# Altium integrated library Integrated_Library - 02.02.25 - 22.49.IntLib: 792 symbols (part 7 of 11) (continued)
## CMP-013-00032-2
designator Q?, comment FDPC5030SG
Asymmetric Dual N-Channel PowerTrench® Power Clip MOSFET, 30 V, -55 to 150 degC, 8-Pin PQFN, RoHS, Tape and Reel; Pins: 10
footprint ONSC-PQFN-8_V (QFN, 8-Leads, Body 5x6mm, Pitch 1.27mm)
footprint ONSC-PQFN-8_V (QFN, 8-Leads, Body 5x6mm, Pitch 1.27mm)
pins: 1 HSG, 2 GR, 3 HSD, 4 HSD, 5 SW, 6 SW, 7 SW, 8 LSG, 9 LSS, 10 HSD

## CMP-013-00033-2
designator Q?, comment DMC1030UFDBQ-7
MOSFET N/P-CH 12V 5.1A UDFN2020; Max Operating Temperature: 150°C; Min Operating Temperature: -55°C; Pins: 6
footprint DMC1030UFDBQ-7-Footprint-1
footprint DMC1030UFDBQ-7-Footprint-1
part A pins: 1 S1, 2 G1, 6 D1
part B pins: 3 D2, 4 S2, 5 G2

## CMP-014-000000-1
designator X?, comment PTS526SM15SMTR2_LFS
Tactile Switches 50mA 12VDC, 5.2x5.2mm, 1.5mm H, 160gf, G leads, No ground pin, metal actuator; Manufacturer_Name: C & K COMPONENTS; Manufacturer_Part_Number: PTS526SM15SMTR2 LFS; Geometry.Height: 1.65mm; Mouser Price/Stock: *; Design Item ID: PTS526SM15SMTR2_LFS; Datasheet Link: https://www.ckswitches.com/media/2780/pts526.pdf; Arrow Part Number: *; Source: PTS526SM15SMTR2_LFS.SchLib; Arrow Price/Stock: *; Mouser Part Number: *
footprint PTS526SM15SMTR2LFS
footprint PTS526SM15SMTR2LFS
pins: 1 COM_1, 2 COM_2, 3 NO_1, 4 NO_2

## CMP-014-00000-3
designator U?, comment TSV991AIQ1T
Rail-to-rail Input / Output GBP Operational Amplifier, 20 MHz, -40 to 125 degC, 6-Pin DFN, RoHS, Tape and Reel; Channels: 2; Min Operating Temperature: -40°C; Pins: 6; Max Operating Temperature: 125°C
footprint STM-DFN-8_V (DFN, 8-Leads, Body 2x2mm, Pitch 0.5mm)
footprint STM-DFN-8_V (DFN, 8-Leads, Body 2x2mm, Pitch 0.5mm)
pins: 1 IN- (in), 2 IN+ (in), 3 NC, 4 OUT (out), 5 VCC- (power), 6 VCC+ (power)

## CMP-014-00001-3
designator U?, comment INA230AIRGT
High or Low Side Measurement, 2.7 to 5.5 V, -40 to 125 degC, 16-Pin QFN, RoHS, Tape and Reel; Mounting Technology: SurfaceMount; Pins: 17
footprint RGT0016C_V (QFN, 16-Leads, Body 3x3mm, Pitch 0.5mm, Thermal Pad 1.65x1.65mm)
footprint RGT0016C_V (QFN, 16-Leads, Body 3x3mm, Pitch 0.5mm, Thermal Pad 1.65x1.65mm)
pins: 1 A0 (in), 2 A1 (in), 3 ALERT (oc), 4 SDA (io), 5 SCL (in), 6 NC, 7 NC, 8 NC, 9 VS (power), 10 GND (power), 11 BUS (in), 12 IN- (in), 13 IN+ (in), 14 NC, 15 NC, 16 NC, 17 EP (power)

## CMP-014-00002-2
designator U, comment INA333AIDGKR
Low-Power, Zero-Drift, Precision Instrumentation Amplifier 8-VSSOP -40 to 125; MF: Texas Instruments; DigiKey-Purchase-URL: https://snapeda.com/shop?store=DigiKey&id=53142; Case/Package: VSSOP-8 Texas Instruments; Texas_Instruments-Purchase-URL: https://snapeda.com/shop?store=Texas+Instruments&id=53142; Value: *; Component Type: Standard; Digi-Key_Part_Number: 296-23564-1-ND; Mouser-Purchase-URL: https://snapeda.com/shop?store=Mouser&id=53142; SnapEDA_Link: https://www.snapeda.com/parts/INA333AIDGKR/Texas%20Instruments/view-part/53142/?ref=snap; Source: INA333AIDGKR.SchLib; Pins: 8; Design Item ID: INA333AIDGKR; MP: INA333AIDGKR
footprint SOP65P490X110-8N
footprint SOP65P490X110-8N
pins: 1 RG1 (io), 2 VIN- (in), 3 VIN+ (in), 4 V- (power), 5 REF (in), 6 VOUT (out), 7 V+ (power), 8 RG2 (io)

## CMP-014-00003-4
designator U?, comment OPA333AIDCKR
1.8-V, 17-&micro;A, microPower, precision, zero-drift CMOS op amp 5-SC70 -40 to 125; MF: Texas Instruments; Purchase-URL: https://pricing.snapeda.com/search/part/OPA333AIDCKR/?ref=eda; Design Item ID: OPA333AIDCKR; MP: OPA333AIDCKR; Value: *; Check_prices: https://www.snapeda.com/parts/OPA333AIDCKR/Texas%20Instruments/view-part/282541/?ref=eda; Case/Package: SOT-SC70-5 Texas Instruments; Source: OPA333AIDCKR.SchLib; Pins: 5; SnapEDA_Link: https://www.snapeda.com/parts/OPA333AIDCKR/Texas%20Instruments/view-part/282541/?ref=snap; Component Type: Standard; Availability: Good; Price: None
footprint SOT65P210X110-5N
footprint SOT65P210X110-5N
pins: 1 +IN (in), 2 V- (power), 3 -IN (in), 4 OUT (out), 5 V+ (power)

## CMP-014-00004-2
designator U?, comment INA333AIDGKR
Instrumentation Amplifier, 1 Func, 25uV Offset-Max, 0.15MHz Band Width, PDSO8; Common Mode Rejection Ratio-Min: 80dB; Average Bias Current-Max (IIB): 200pA; Channels: 1; Bandwidth (3dB)-Nom: 150kHz; Nominal Supply Voltage: 5V; Pins: 8; Max Operating Temperature: 125°C; RoHS Compliant: Yes; Case/Package: TSSOP; Amplifier Type: INSTRUMENTATION AMPLIFIER; Min Operating Temperature: -40°C
footprint DGK0008A_N-37 (TSOP, 8-Leads, Body 3.1x3.1mm, Pitch 0.65mm, IPC Medium Density)
footprint DGK0008A_L-38 (TSOP, 8-Leads, Body 3.1x3.1mm, Pitch 0.65mm, IPC High Density)
footprint DGK0008A_M-39 (TSOP, 8-Leads, Body 3.1x3.1mm, Pitch 0.65mm, IPC Low Density)
pins: 1 RG (in), 2 VIN- (in), 3 VIN+ (in), 4 V- (power), 5 REF (in), 6 VOUT (out), 7 V+ (power), 8 RG (in)

## CMP-014-00005-1
designator U?, comment OPA333AIDCKR
Operational Amplifier, 1 Func, 10uV Offset-Max, CMOS, PDSO5; Nominal Supply Voltage: 5V; Average Bias Current-Max (IIB): 200pA; Architecture: VOLTAGE-FEEDBACK; Channels: 1; Power: 0W; Bias Current-Max (IIB) @25C: 200pA; Amplifier Type: OPERATIONAL AMPLIFIER; Case/Package: TSSOP; RoHS Compliant: Yes; Pins: 5; Min Operating Temperature: -40°C; Max Operating Temperature: 125°C
footprint FP-DCK0005A-MFG
footprint FP-DCK0005A-IPC_C
footprint FP-DCK0005A-IPC_B
footprint FP-DCK0005A-IPC_A
pins: 1 +IN (hiz), 2 V- (power), 3 -IN (hiz), 4 OUT (out), 5 V+ (power)
text: +; -

## CMP-014-00006-1
designator U?, comment BGA524N6E6327XTSA1
Telecom Circuit, 1-Func, PDSO6; Nominal Supply Voltage: 1.8V; Channels: 1; Height - Seated (Max): 0.4mm; Max Operating Temperature: 85°C; Min Operating Temperature: -40°C; Length: 1.1mm; JESD-609 Code: e3; Pins: 6; JESD-30 Code: R-PDSO-N6; Case/Package: VSON; RoHS Compliant: Yes
footprint FP-PG-TSNP-6-MFG
pins: 1 GND (power), 2 VCC (power), 3 AO (out), 4 GND (power), 5 AI (in), 6 PON (power)

## CMP-014-00014-2
designator U?, comment LM339AN
Quad Differential Comparator, 2 to 30 V, 0 to 70 degC, 14-Pin DIP (N), Pb-Free (RoHS), Tube; Manufacturer: Texas Instruments (TI); Min Supply Voltage: 2V; Nominal Supply Current: 500uA; Elements: 4; Power: 1.05W; Nominal Voltage Gain: 106.02dB; Max Dual Supply Voltage: 15V; Max Supply Voltage: 30V; Min Dual Supply Voltage: 1V; Datasheet Version: SLCS006S, 08/2012; Pins: 14; Datasheet URL: http://www.ti.com/general/docs/lit/getliterature.tsp?genericPartNumber=LM339A&fileType=pdf; Package Description: 14-Pin Double In-line Package, Body 19.305 x 6.35 mm, Pitch 2.54 mm; Packaging: Rail/Tube; Case/Package: PDIP; Mounting Technology: TH; Package Quantity: 25; Manufacturer URL: http://www.ti.com/; Min Operating Temperature: 0°C; Package Reference: N-14; RoHS Compliant: True; Package URL: http://www.ti.com/lit/ml/mpdi002c/mpdi002c.pdf; Max Operating Temperature: 70°C
footprint TI-N0014A (DIP, 14-Leads, Body 19.7x6.6mm, Pitch 2.54mm)
pins on every part: 3 VCC (power), 12 GND (power)
part A pins: 1 OUT1 (oc), 6 IN1- (in), 7 IN1+ (in)
part B pins: 2 OUT2 (oc), 4 IN2- (in), 5 IN2+ (in)
part C pins: 8 IN3- (in), 9 IN3+ (in), 14 OUT3 (oc)
part D pins: 10 IN4- (in), 11 IN4+ (in), 13 OUT4 (oc)

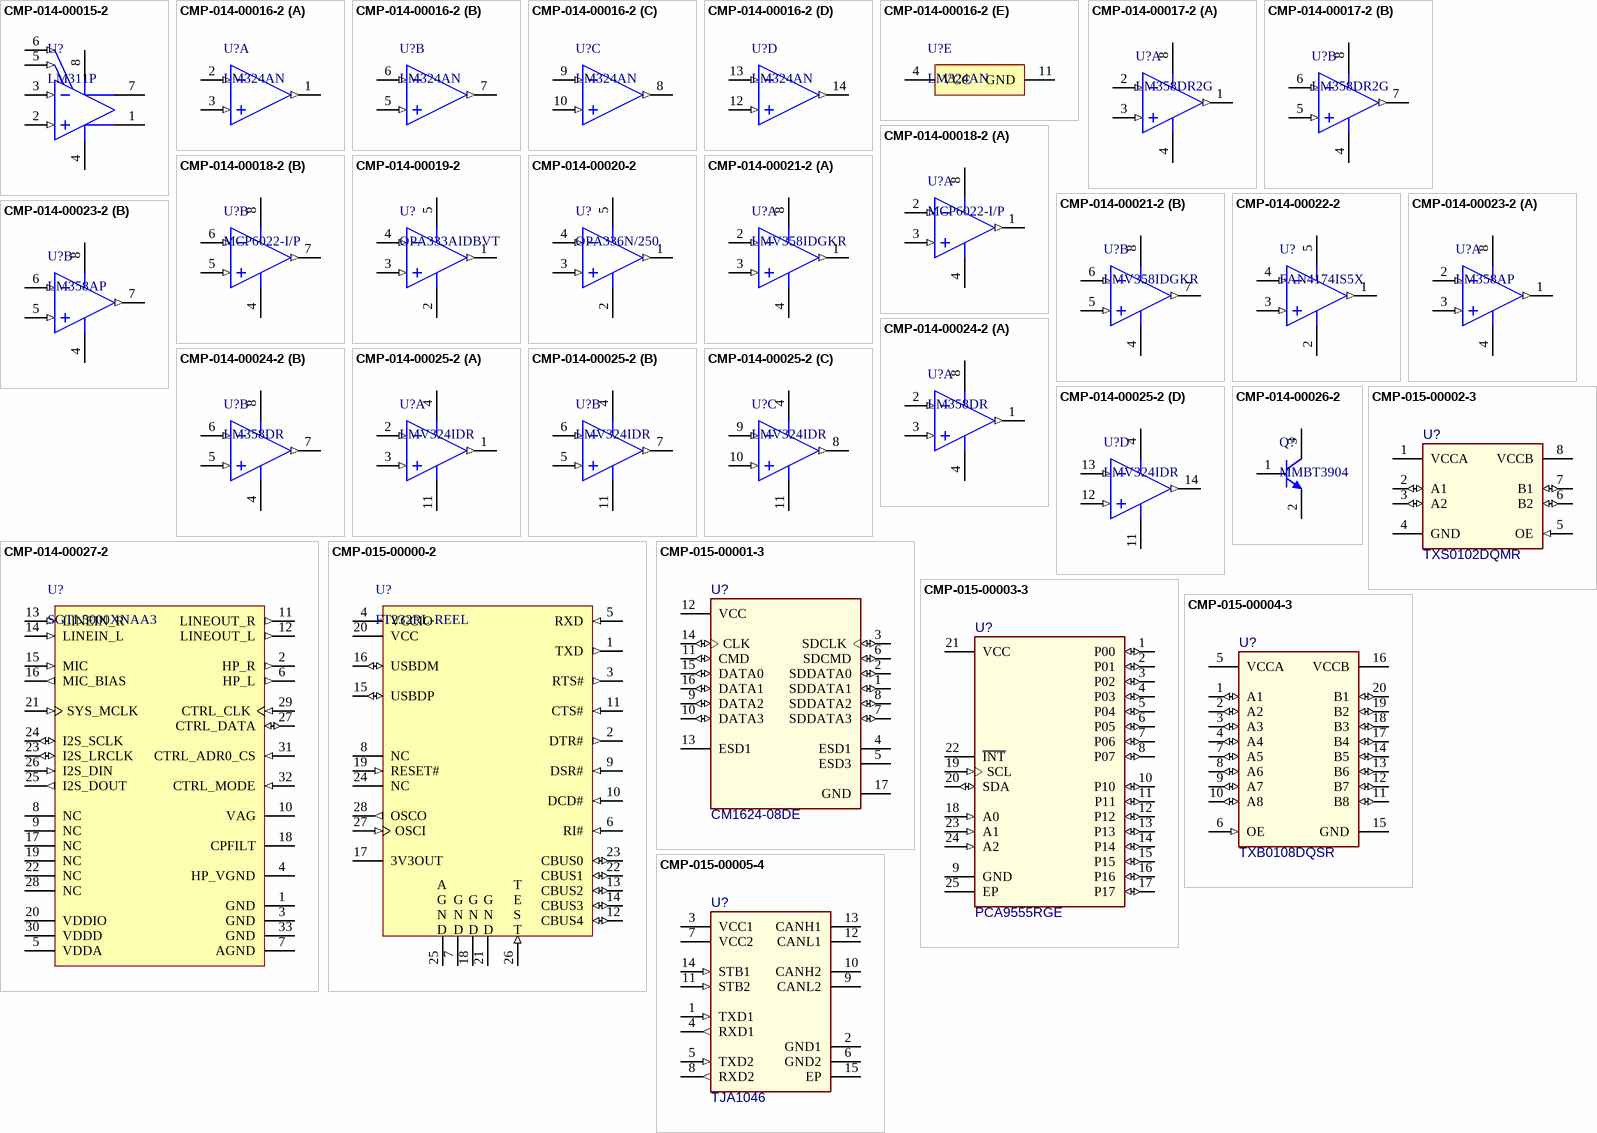
[diagram p17: symbols CMP-014-00015-2 to CMP-015-00005-4]

## CMP-014-00015-2
designator U?, comment LM311P
Quad Differential Comparator, 3.5 to 30 V, 0 to 70 degC, 8-Pin PDIP (P), Pb-Free (RoHS), Tube; Manufacturer: Texas Instruments (TI); Nominal Dual Supply Voltage: 12V; Channels: 1; Nominal Voltage Gain: 106.02dB; Propagation Delay: 115ns; Max Dual Supply Voltage: 15V; Min Dual Supply Voltage: 1.75V; Min Supply Voltage: 3.5V; Max Supply Voltage: 30V; Nominal Supply Current: 7.5mA; Package Version: 4040082/E, 04/2010; Mounting Technology: TH; RoHS Compliant: True; Pins: 8; Datasheet URL: http://www.ti.com/general/docs/lit/getliterature.tsp?genericPartNumber=LM311&fileType=pdf; Packaging: Rail/Tube; Package Quantity: 50; Max Operating Temperature: 70°C; Package Description: 8-Pin Double In-line Package, Body 9.59 x 6.35 mm, Pitch 2.54 mm; Nominal Supply Voltage: 12V; Datasheet Version: SLCS007I, 06/2015; Manufacturer URL: http://www.ti.com/; Package URL: http://www.ti.com/lit/ml/mpdi001b/mpdi001b.pdf; Package Reference: P0008A; Elements: 1; Min Operating Temperature: 0°C; Case/Package: PDIP
footprint P0008A (DIP, 8-Leads, Body 10.15x6.6mm, Pitch 2.54mm)
pins: 1 EMIT OUT, 2 IN+ (in), 3 IN- (in), 4 VCC- (power), 5 BALANCE (in), 6 BAL/STRB (in), 7 COL OUT, 8 VCC+ (power)

## CMP-014-00016-2
designator U?, comment LM324AN
Quadruple Operational Amplifier, 1.2 MHz, 0 to 70 degC, 14-Pin PDIP (N), Pb-Free (RoHS), Tube; Manufacturer: Texas Instruments (TI); Max Dual Supply Voltage: 16V; Nominal Dual Supply Voltage: 12V; Nominal Voltage Gain: 100dB; Min Supply Voltage: 1.5V; Unity Gain Bandwidth Product: 1.2MHz; Output Current: 30mA; Nominal Supply Current: 3mA; RoHS Compliant: True; Package Reference: N-14; Min Operating Temperature: 0°C; Case/Package: DIP; Mounting Technology: TH; Package Description: 14-Pin Double In-line Package, Body 19.305 x 6.35 mm, Pitch 2.54 mm; Nominal Supply Voltage: 12V; Package URL: http://www.ti.com/lit/ml/mpdi002c/mpdi002c.pdf; Package Quantity: 25; Datasheet Version: SLOS066W, 03/2015; Manufacturer URL: http://www.ti.com/; Datasheet URL: http://www.ti.com/lit/ds/symlink/lm324a.pdf; Min Dual Supply Voltage: 1.5V; Max Supply Voltage: 16V; Pins: 14; Max Operating Temperature: 70°C
footprint TI-N0014A (DIP, 14-Leads, Body 19.7x6.6mm, Pitch 2.54mm)
part A pins: 1 1OUT (out) "Output", 2 1IN- (in) "Negative input", 3 1IN+ (in) "Positive input"
part B pins: 5 2IN+ (in) "Positive input", 6 2IN- (in) "Negative input", 7 2OUT (out) "Output"
part C pins: 8 3OUT (out) "Output", 9 3IN- (in) "Negative input", 10 3IN+ (in) "Positive input"
part D pins: 12 4IN+ (in) "Positive input", 13 4IN- (in) "Negative input", 14 4OUT (out) "Output"
part E pins: 4 VCC (power) "Power supply", 11 GND (power) "Ground"

## CMP-014-00017-2
designator U?, comment LM358DR2G
Single Supply Dual Operational Amplifier, 3 to 32 V, 0 to 70 degC, 8-Pin SOIC, Pb-Free, Tape and Reel; Manufacturer: ON Semiconductor; Max Supply Voltage: 44V; Max Input Voltage: 28.3V; Nominal Voltage Gain: 100dB; Slew Rate: 0.07V/us; Common Mode Rejection Ratio: 65dB; Nominal Supply Voltage: 12V; Min Supply Voltage: 2.3V; Channels: 2; Max Dual Supply Voltage: 16V; Nominal Supply Current: 35uA; Output Current: 40mA; Min Dual Supply Voltage: 1.5V; Nominal Gain Bandwith Product: 200KHz; Min Input Voltage: 0uV; Package Reference: SOIC-8-751-07; Package Description: 8-Pin Small Outline Integrated Circuit, Body 4.9 x 3.9 mm, Pitch 1.27 mm; Min Operating Temperature: 0°C; Max Operating Temperature: 70°C; Case/Package: SOIC; Datasheet URL: http://www.onsemi.cn/pub_link/Collateral/LM358-D.PDF; Manufacturer URL: http://www.onsemi.com/; Packaging: TapeandReel; Pins: 8; RoHS Compliant: True; Datasheet Version: Rev. 32, 10/2016; Package Quantity: 2500; Nominal Dual Supply Voltage: 12V; Mounting Technology: SM
footprint ONSC-SOIC-8-751-07_V (SOIC, 8-Leads, Body 4.9x3.9mm, Pitch 1.27mm)
pins on every part: 4 VEE/GND (power), 8 VCC (power)
part A pins: 1 OUTA (out), 2 INA- (in), 3 INA+ (in)
part B pins: 5 INB+ (in), 6 INB- (in), 7 OUTB (out)

## CMP-014-00018-2
designator U?, comment MCP6022-I/P
Rail-to-Rail Input/Output, 10 MHz Op Amp, 7 V/us, 1 mA, 2.5 to 5.5 V, -40 to 85 degC, 8-Pin PDIP (P), RoHS, Tube; Manufacturer: Microchip Technology; Nominal Supply Current: 1mA; Max Ouput Current: 30mA; Min Supply Voltage: 3V; Unity Gain Bandwidth Product: 10MHz; Nominal Voltage Gain: 110dB; Common Mode Rejection Ratio: 70dB; Min Input Voltage: -300mV; Channels: 2; Max Input Voltage: 5.8V; Output Current: 22mA; Max Supply Voltage: 5V; Slew Rate: 7V/us; RoHS Compliant: True; Package Quantity: 60; Max Operating Temperature: 85°C; Case/Package: PDIP; Datasheet URL: http://ww1.microchip.com/downloads/en/DeviceDoc/20001685E.pdf; Mounting Technology: TH; Min Operating Temperature: -40°C; Manufacturer URL: http://www.microchip.com/; Datasheet Version: Rev. E, 01/2017; Packaging: Rail/Tube; Package Description: 8-Pin Double In-line Package, Body 9.46 x 6.35 mm, Pitch 2.54 mm; Package URL: http://www.microchip.com/stellent/groups/techpub_sg/documents/packagingspec/en012702.pdf; Package Reference: P-8; Nominal Gain Bandwith Product: 10MHz; Pins: 8
footprint MCHP-P-8 (DIP, 8-Leads, Body 9.8x6.6mm, Pitch 2.54mm)
pins on every part: 4 VSS (power), 8 VDD (power)
part A pins: 1 VOUTA (out), 2 VINA- (in), 3 VINA+ (in)
part B pins: 5 VINB+ (in), 6 VINB- (in), 7 VOUTB (out)

## CMP-014-00019-2
designator U?, comment OPA333AIDBVT
MicroPower, Zero Drift CMOS Operational Amplifier, 1.8 to 5.5 V, 17 uA, -40 to 125 degC, 5-Pin SOT23 (DBV5), Green (RoHS & no Sb/Br), Tape and Reel; Manufacturer: Texas Instruments (TI); Min Supply Voltage: 900mV; Unity Gain Bandwidth Product: 350KHz; Slew Rate: 0.16V/us; Max Dual Supply Voltage: 2.75V; Nominal Voltage Gain: 130dB; Channels: 1; Common Mode Rejection Ratio: 106dB; Output Current: 5mA; Nominal Supply Current: 25uA; Max I/O Voltage: 10uV; Datasheet URL: http://www.ti.com/general/docs/lit/getliterature.tsp?genericPartNumber=OPA333&fileType=pdf; Manufacturer URL: http://www.ti.com/; Min Dual Supply Voltage: 900mV; Case/Package: SOT-23-5; Packaging: TapeandReel; RoHS Compliant: True; Package URL: http://www.ti.com/lit/ml/mpds018l/mpds018l.pdf; Package Quantity: 250; Mounting Technology: SM; Package Reference: DBV0005A; Nominal Gain Bandwith Product: 350KHz; Max Operating Temperature: 125°C; Pins: 5; Max Supply Voltage: 2.75V; Package Description: 5-Pin Small Outline Transistor, Body 2.9 x 1.6 mm, Pitch 0.95 mm; Datasheet Version: SBOS351E, 12/2015; Min Operating Temperature: -40°C
footprint DBV0005A_L (SOT23, 5-Leads, Body 3.05x1.75mm, Pitch 0.95mm, IPC High Density)
footprint DBV0005A_N (SOT23, 5-Leads, Body 3.05x1.75mm, Pitch 0.95mm, IPC Medium Density)
footprint DBV0005A_M (SOT23, 5-Leads, Body 3.05x1.75mm, Pitch 0.95mm, IPC Low Density)
pins: 1 OUT (out) "Output", 2 V- (power) "Negative (lowest) power supply", 3 +IN (in) "Noninverting input", 4 -IN (in) "Inverting input", 5 V+ (power) "Positive (highest) power supply"

## CMP-014-00020-2
designator U?, comment OPA336N/250
Single-Supply, MicroPower CMOS Operational Amplifier, 2.3 to 5.5 V, -55 to 125 degC, 5-Pin SOT23 (DBV5), Green (RoHS & no Sb/Br), Tape and Reel; Manufacturer: Texas Instruments (TI); Max Supply Voltage: 5V; Unity Gain Bandwidth Product: 100KHz; Slew Rate: 0.03V/us; Nominal Gain Bandwith Product: 11MHz; Common Mode Rejection Ratio: 80dB; Channels: 1; Max I/O Voltage: 125uV; Min Supply Voltage: 3V; Nominal Voltage Gain: 115dB; Nominal Supply Current: 32uA; Package Quantity: 250; Package Reference: DBV0005A; Datasheet URL: http://www.ti.com/general/docs/lit/getliterature.tsp?genericPartNumber=OPA336&fileType=pdf; Package Description: 5-Pin Small Outline Transistor, Body 2.9 x 1.6 mm, Pitch 0.95 mm; Datasheet Version: SBOS068C, 01/2005; Min Operating Temperature: -40°C; Package URL: http://www.ti.com/lit/ml/mpds018l/mpds018l.pdf; RoHS Compliant: True; Case/Package: SOT-23-5; Mounting Technology: SM; Pins: 5; Max Operating Temperature: 85°C; Packaging: TapeandReel; Manufacturer URL: http://www.ti.com/
footprint DBV0005A_L (SOT23, 5-Leads, Body 3.05x1.75mm, Pitch 0.95mm, IPC High Density)
footprint DBV0005A_N (SOT23, 5-Leads, Body 3.05x1.75mm, Pitch 0.95mm, IPC Medium Density)
footprint DBV0005A_M (SOT23, 5-Leads, Body 3.05x1.75mm, Pitch 0.95mm, IPC Low Density)
pins: 1 OUT (out), 2 V- (power), 3 IN+ (in), 4 IN- (in), 5 V+ (power)

## CMP-014-00021-2
designator U?, comment LMV358IDGKR
Low-Voltage Rail-to-Rail Output Operational Amplifier, 2.7 to 5.5 V, -40 to 125 degC, 8-Pin VSSOP (DGK), Green (RoHS & no Sb/Br), Tape and Reel; Manufacturer: Texas Instruments (TI); Max Supply Voltage: 5.5V; Slew Rate: 1V/us; Nominal Voltage Gain: 100dB; Min Supply Voltage: 2.7V; Output Current: 160mA; Channels: 2; Common Mode Rejection Ratio: 50dB; Unity Gain Bandwidth Product: 1MHz; Nominal Supply Current: 440uA; Manufacturer URL: http://www.ti.com/; RoHS Compliant: True; Datasheet URL: http://www.ti.com/lit/ds/symlink/lmv358.pdf; Package URL: http://www.ti.com/litv/pdf/mpds028d; Case/Package: MSOP; Package Reference: DGK0008A; Datasheet Version: SLOS263W, 10/2014; Mounting Technology: SM; Min Operating Temperature: -40°C; Package Quantity: 2500; Package Description: 8-Pin Thin Small Outline Package, Body 3 x 3 mm, Pitch 0.65 mm; Packaging: TapeandReel; Pins: 8; Max Operating Temperature: 85°C; Nominal Gain Bandwith Product: 1MHz
footprint DGK0008A_N (TSOP, 8-Leads, Body 3.1x3.1mm, Pitch 0.65mm, IPC Medium Density)
footprint DGK0008A_M (TSOP, 8-Leads, Body 3.1x3.1mm, Pitch 0.65mm, IPC Low Density)
footprint DGK0008A_L (TSOP, 8-Leads, Body 3.1x3.1mm, Pitch 0.65mm, IPC High Density)
pins on every part: 4 GND (power), 8 VCC+ (power)
part A pins: 1 1OUT (out), 2 1IN- (in), 3 1IN+ (in)
part B pins: 5 2IN+ (in), 6 2IN- (in), 7 2OUT (out)

## CMP-014-00022-2
designator U?, comment FAN4174IS5X
Single, Rail-to-Rail I/O, CMOS Amplifier, 2.3 to 5.25 V, -40 to 125 degC, 5-Pin SOT23, RoHS, Tape and Reel; Manufacturer: Fairchild Semiconductor; Min Supply Voltage: 2.3V; Package Version: Aug-15; Nominal Supply Voltage: 3V; Common Mode Rejection Ratio: 58dB; Channels: 1; Nominal Gain Bandwith Product: 3.7MHz; Nominal Voltage Gain: 102dB; Max Supply Voltage: 5.25V; Slew Rate: 3V/us; Nominal Supply Current: 300uA; Mounting Technology: SM; Max Operating Temperature: 85°C; RoHS Compliant: True; Case/Package: SOT-23-5; Datasheet Version: Rev. 1.0.9, 01/2013; Package URL: https://www.fairchildsemi.com/package-drawings/MA/MA05B.pdf; Packaging: TapeandReel; Datasheet URL: https://www.fairchildsemi.com/datasheets/FA/FAN4174.pdf; Min Operating Temperature: -40°C; Pins: 5; Package Description: 5-Pin Small Outline Transistor, Body 2.9 x 1.6 mm, Pitch 0.95 mm; Package Reference: SOT23-5; Package Quantity: 3000; Manufacturer URL: https://www.fairchildsemi.com/; Unity Gain Bandwidth Product: 3.7MHz
footprint FAIR-SOT23-5_V (SOT23, 5-Leads, Body 3x1.7mm, Pitch 0.95mm)
pins: 1 OUT (out) "Output", 2 -VS (power) "Negative Supply", 3 +IN (in) "Positive Input", 4 -IN (in) "Negative Input", 5 +VS (power) "Positive Supply"

## CMP-014-00023-2
designator U?, comment LM358AP
Dual Operational Amplifier, 3 to 32 V, 0 to 70 degC, 8-Pin PDIP (P), Pb-Free (RoHS), Tube; Manufacturer: Texas Instruments (TI); Channels: 2; Max Dual Supply Voltage: 16V; Min Dual Supply Voltage: 1.5V; Slew Rate: 0.3V/us; Unity Gain Bandwidth Product: 700KHz; Common Mode Rejection Ratio: 65dB; Nominal Supply Voltage: 5V; Package Version: 4040082/E, 04/2010; Output Current: 30mA; Nominal Supply Current: 1.2mA; Nominal Voltage Gain: 100dB; Case/Package: DIP; Max Operating Temperature: 70°C; RoHS Compliant: True; Manufacturer URL: http://www.ti.com/; Pins: 8; Package Description: 8-Pin Double In-line Package, Body 9.59 x 6.35 mm, Pitch 2.54 mm; Datasheet URL: http://www.ti.com/lit/ds/symlink/lm358a.pdf; Max Supply Voltage: 16V; Package Reference: P0008A; Mounting Technology: TH; Min Operating Temperature: 0°C; Package URL: http://www.ti.com/lit/ml/mpdi001b/mpdi001b.pdf; Min Supply Voltage: 1.5V; Package Quantity: 50; Packaging: Rail/Tube; Datasheet Version: SLOS068T, 04/2015; Nominal Gain Bandwith Product: 700KHz
footprint P0008A (DIP, 8-Leads, Body 10.15x6.6mm, Pitch 2.54mm)
pins on every part: 4 GND (power), 8 VCC (power)
part A pins: 1 1OUT (out), 2 1IN- (in), 3 1IN+ (in)
part B pins: 5 2IN+ (in), 6 2IN- (in), 7 2OUT (out)

## CMP-014-00024-2
designator U?, comment LM358DR
Dual Operational Amplifier, 3 to 32 V, 0 to 70 degC, 8-Pin SOIC (D), Green (RoHS & no Sb/Br), Tape and Reel; Manufacturer: Texas Instruments (TI); Channels: 2; Min Supply Voltage: 1.5V; Max Supply Voltage: 16V; Package Version: 4040047-3/M, 06/2011; Common Mode Rejection Ratio: 65dB; Nominal Dual Supply Voltage: 12V; Output Current: 30mA; Slew Rate: 0.3V/us; Unity Gain Bandwidth Product: 700KHz; Nominal Supply Current: 1.2mA; Nominal Voltage Gain: 100dB; Packaging: CutTape; Manufacturer URL: http://www.ti.com/; RoHS Compliant: True; Datasheet Version: SLOS068T, 04/2015; Min Dual Supply Voltage: 1.5V; Max Operating Temperature: 70°C; Package Description: 8-Pin Small Outline Integrated Circuit, Body 4.9 x 3.9 mm, Pitch 1.27 mm; Package Reference: D0008A; Max Dual Supply Voltage: 16V; Nominal Supply Voltage: 12V; Mounting Technology: SM; Datasheet URL: http://www.ti.com/lit/ds/symlink/lm358.pdf; Case/Package: SOIC; Package URL: http://www.ti.com/lit/ml/msoi002j/msoi002j.pdf; Min Operating Temperature: 0°C; Pins: 8; Package Quantity: 1; Nominal Gain Bandwith Product: 700KHz
footprint D0008A_L (SOIC, 8-Leads, Body 5x4mm, Pitch 1.27mm, IPC High Density)
pins on every part: 4 GND (power), 8 VCC (power)
part A pins: 1 1OUT (out), 2 1IN- (in), 3 1IN+ (in)
part B pins: 5 2IN+ (in), 6 2IN- (in), 7 2OUT (out)

## CMP-014-00025-2
designator U?, comment LMV324IDR
Quad Low-Voltage Rail-to-Rail Output Operational Amplifier, 2.7 to 5.5 V, -40 to 125 degC, 14-Pin SOIC (D), Green (RoHS & no Sb/Br), Tape and Reel; Manufacturer: Texas Instruments (TI); Unity Gain Bandwidth Product: 1MHz; Slew Rate: 1V/us; Max Supply Voltage: 5V; Common Mode Rejection Ratio: 50dB; Min Supply Voltage: 3V; Nominal Supply Current: 170uA; Channels: 4; Output Current: 160mA; Nominal Voltage Gain: 100dB; Package Quantity: 2500; Package Description: 14-Pin Small Outline Integrated Circuit, Body 8.65 x 3.9 mm, Pitch 1.27 mm; Packaging: TapeandReel; Max Operating Temperature: 85°C; Nominal Gain Bandwith Product: 1MHz; Package URL: http://www.ti.com/lit/ml/mpds177g/mpds177g.pdf; Min Operating Temperature: -40°C; Package Reference: D0014A; RoHS Compliant: True; Datasheet URL: http://www.ti.com/lit/ds/symlink/lmv324.pdf; Mounting Technology: SM; Datasheet Version: SLOS263W, 10/2014; Manufacturer URL: http://www.ti.com/; Case/Package: SOIC; Pins: 14
footprint D0014A_V (SOIC, 14-Leads, Body 8.75x4mm, Pitch 1.27mm)
pins on every part: 4 VCC+ (power), 11 GND (power)
part A pins: 1 1OUT (out), 2 1IN- (in), 3 1IN+ (in)
part B pins: 5 2IN+ (in), 6 2IN- (in), 7 2OUT (out)
part C pins: 8 3OUT (out), 9 3IN- (in), 10 3IN+ (in)
part D pins: 12 4IN+ (in), 13 4IN- (in), 14 4OUT (out)

## CMP-014-00026-2
designator Q?, comment MMBT3904
NPN General Purpose Amplifier, 40 V, 0.2 A, -55 to 150 degC, 3-Pin SOT23, RoHS, Tape and Reel; Manufacturer: Fairchild Semiconductor; Package Version: Rev. 12, 03/2016; Elements: 1; Power: 625mW; hFE Min: 100; Vce Max: 300mV; Frequency: 300MHz; Pins: 3; Package Description: 3-Pin Small Outline Transistor, Body 2.92 x 1.325 mm, Pitch 0.95 mm; RoHS Compliant: True; Package Quantity: 3000; Manufacturer URL: https://www.fairchildsemi.com/; Packaging: TapeandReel; Min Operating Temperature: -55°C; Max Operating Temperature: 150°C; Mounting Technology: SM; Case/Package: TO-236-3; Package Reference: SOT23-3; Datasheet Version: Rev. 1.1.0, 10/2014; Datasheet URL: https://www.fairchildsemi.com/datasheets/MM/MMBT3904.pdf; Package URL: http://www.fairchildsemi.com/dwg/MA/MA03D.pdf
footprint FAIR-SOT23-3_V (SOT23, 3-Leads, Body 3.12x1.5mm, Pitch 0.95mm)
pins: 1 B, 2 E, 3 C

## CMP-014-00027-2
designator U?, comment SGTL5000XNAA3
Low Power Stereo Codec with Headphone Amp, 1.1 to 2 V, -40 to 85 degC, 32-Pin QFN-EP, RoHS, Tray; Manufacturer: NXP / Freescale; Max Supply Voltage: 3.6V; Channels: 2; Min Supply Voltage: 2V; Pins: 32; Min Operating Temperature: -40°C; Case/Package: QFN; Package Quantity: 2450; Datasheet URL: http://cache.freescale.com/files/analog/doc/data_sheet/SGTL5000.pdf?pspll=1&Parent_nodeId=1227651963351723867067&Parent_pageType=product; RoHS Compliant: True; Datasheet Version: Rev. 6.0, 11/2013; Packaging: Tray; Max Operating Temperature: 85°C
footprint FRES-QFN-EP-32_N (QFN, 32-Leads, Body 5.00x5.00mm, Pitch 0.50mm, Thermal Pad 3.40x3.40mm, IPC Medium Density)
footprint FRES-QFN-EP-32_L (QFN, 32-Leads, Body 5.00x5.00mm, Pitch 0.50mm, Thermal Pad 3.40x3.40mm, IPC High Density)
footprint FRES-QFN-EP-32_M (QFN, 32-Leads, Body 5.00x5.00mm, Pitch 0.50mm, Thermal Pad 3.40x3.40mm, IPC Low Density)
pins: 1 GND (power) "Ground", 2 HP_R (out) "Right headphone output", 3 GND (power) "Ground", 4 HP_VGND (power) "Headphone virtual ground", 5 VDDA (power) "Analog voltage", 6 HP_L (out) "Left headphone output", 7 AGND (power) "Ground", 8 NC "No Connect", 9 NC "No Connect", 10 VAG "DAC VAG filter", 11 LINEOUT_R (out) "Right LINEOUT", 12 LINEOUT_L (out) "Left LINEOUT", 13 LINEIN_R (in) "Right LINEIN", 14 LINEIN_L (in) "Left LINEIN", 15 MIC (in) "Microphone input", 16 MIC_BIAS (out) "Mic bias", 17 NC "No Connect", 18 CPFILT "Charge Pump Filter", 19 NC "No Connect", 20 VDDIO (power) "Digital I/O voltage", 21 SYS_MCLK (in) "System master clock", 22 NC "No Connect", 23 I2S_LRCLK (io) "I2S frame clock", 24 I2S_SCLK (io) "I2S bit clock", 25 I2S_DOUT (out) "I2S data output", 26 I2S_DIN (in) "I2S data input", 27 CTRL_DATA (io) "I2C Mode: Serial Data (SDA); SPI Mode: Serial Data Input (MOSI)", 28 NC "No Connect", 29 CTRL_CLK (in) "I2C Mode: Serial Clock (SCL); SPI Mode: Serial Clock (SCK)", 30 VDDD (power) "Digital voltage", 31 CTRL_ADR0_CS (in) "I2C Mode: I2C Address Select 0; SPI Mode: SPI Chip Select", 32 CTRL_MODE (in) "Mode select for I2C or SPI; When pulled low the control mode is I2C, when pulled high the control mode is SPI", 33 GND (power) "Ground"

## CMP-015-00000-2
designator U?, comment FT232RL-REEL
USB UART IC, -0.5 to 6 V, 24 mA, -40 to 85 degC, 28-Pin SSOP, RoHS, Tape and Reel; Manufacturer: Future Technology Devices International (FTDI); Data Rate: 3Mbps; Channels: 1; Min Supply Voltage: 3.3V; Nominal Supply Voltage: 5V; Max Supply Voltage: 5.25V; Datasheet Version: Rev. 1.04, 02/2006; RoHS Compliant: True; Package Quantity: 2000; Manufacturer URL: http://www.ftdichip.com/; Interface: UART; Packaging: TapeandReel; Case/Package: SSOP; Datasheet URL: http://datasheet.octopart.com/FT232RL-FTDI-datasheet-120501.pdf; Min Operating Temperature: -40°C; Max Operating Temperature: 85°C; Pins: 16
footprint FTDI-SSOP-28_M (SOP, 28-Leads, Body 10.5x5.6mm, Pitch 0.65mm, IPC Low Density)
footprint FTDI-SSOP-28_L (SOP, 28-Leads, Body 10.5x5.6mm, Pitch 0.65mm, IPC High Density)
footprint FTDI-SSOP-28_N (SOP, 28-Leads, Body 10.5x5.6mm, Pitch 0.65mm, IPC Medium Density)
pins: 1 TXD (out) "Transmit Asynchronous Data Output", 2 DTR# (out) "Data Terminal Ready Control Output / Handshake signal", 3 RTS# (out) "Request To Send Control Output / Handshake signal", 4 VCCIO (power) "+1.8V to +5.25V supply to the UART Interface and CBUS group pins", 5 RXD (in) "Receive Asynchronous Data Input", 6 RI# (in) "Ring Indicator Control Input. When remote wake up is enabled in the internal EEPROM taking RI# low can be used to resume the PC USB host controller from suspend.", 7 GND (power) "Device ground supply pins", 8 NC "No internal connection", 9 DSR# (in) "Data Set Ready Control Input / Handshake signal", 10 DCD# (in) "Data Carrier Detect Control input", 11 CTS# (in) "Clear to Send Control input / Handshake signal", 12 CBUS4 (io) "Con?gurable CBUS I/O Pin. Function of this pin is con?gured in the device internal EEPROM", 13 CBUS2 (io) "Con?gurable CBUS I/O Pin. Function of this pin is con?gured in the device internal EEPROM", 14 CBUS3 (io) "Con?gurable CBUS I/O Pin. Function of this pin is con?gured in the device internal EEPROM", 15 USBDP (io) "USB Data Signal Plus, incorporating internal series resistor and 1.5k ohm pull up resistor to 3.3V", 16 USBDM (io) "USB Data Signal Minus, incorporating internal series resistor", 17 3V3OUT (power) "3.3V output from integrated L.D.O. regulator", 18 GND (power) "Device ground supply pins", 19 RESET# (in) "Can be used by an external device to reset the FT232R", 20 VCC (power) "3.3V to 5.25V supply to the device core", 21 GND (power) "Device ground supply pins", 22 CBUS1 (io) "Con?gurable CBUS I/O Pin. Function of this pin is con?gured in the device internal EEPROM", 23 CBUS0 (io) "Con?gurable CBUS I/O Pin. Function of this pin is con?gured in the device internal EEPROM", 24 NC "No internal connection", 25 AGND (power) "Device analog ground supply for internal clock multiplier", 26 TEST (in) "Puts the device into I.C. test mode. Must be tied to GND for normal operation", 27 OSCI (in) "Input to 12MHz Oscillator Cell. Optional - Can be left unconnected for normal operation", 28 OSCO (out) "Output from 12MHz Oscillator Cell. Optional - Can be left unconnected for normal operation if internal oscillator is used"
text: A / G / N / D; G / N / D; T / E / S / T

## CMP-015-00001-3
designator U?, comment CM1624-08DE
EMI Filter for T-Flash / MicroSD Interface, -40 to 85 degC, 16-Pin UDFN, Pb-Free, Tape and Reel; ComponentLink1Description: Manufacturer URL; RoHS Compliant: Pb-Free; ComponentLink3URL: http://www.onsemi.com/pub_link/Collateral/517BE.PDF; Mounting Technology: Surface Mount; Pins: 17; ComponentLink2Description: Datasheet; ComponentLink2URL: http://www.onsemi.com/pub_link/Collateral/CM1624-D.PDF; ComponentLink1URL: http://www.onsemi.com/; ComponentLink3Description: Package Specification
footprint ONSC-UDFN-16-517BE-01_V (SON, 16-Leads, Body 3.3x1.35mm, Pitch 0.4mm, Thermal Pad 3x0.5mm)
footprint ONSC-UDFN-16-517BE-01_V (SON, 16-Leads, Body 3.3x1.35mm, Pitch 0.4mm, Thermal Pad 3x0.5mm)
pins: 1 SDDATA1 (io) "Data line #1 input/output with pull-up resistor", 2 SDDATA0 (io) "Data line #0 input/output with pull-up resistor", 3 SDCLK (io) "Clock line Input/Output", 4 ESD1 "Single ESD", 5 ESD3 "Single ESD", 6 SDCMD (io) "Command Line Input/Output", 7 SDDATA3 (io) "Data line #3 input/output with pull-up resistor", 8 SDDATA2 (io) "Data line #2 input/output with pull-up resistor", 9 DATA2 (io) "Data line #2 input/output with pull-up resistor", 10 DATA3 (io) "Data line #3 input/output with pull-up resistor", 11 CMD (io) "Command Line Input/Output", 12 VCC (power) "Power Supply ESD Protection", 13 ESD1 "Single ESD", 14 CLK (io) "Clock line Input/Output", 15 DATA0 (io) "Data line #0 input/output with pull-up resistor", 16 DATA1 (io) "Data line #1 input/output with pull-up resistor", 17 GND (power) "Ground return to shield"

## CMP-015-00002-3
designator U?, comment TXS0102DQMR
IC TRANSLATOR VOLTAGE 8-X2SON; Min Supply Voltage: 1.65V; Max Supply Voltage: 5.5V; Pins: 8; Min Operating Temperature: -40°C; Max Operating Temperature: 85°C
footprint DQM (R-PX2SON-N8)
footprint DQM (R-PX2SON-N8)
pins: 1 VCCA (power), 2 A1 (io), 3 A2 (io), 4 GND (power), 5 OE (in), 6 B2 (io), 7 B1 (io), 8 VCCB (power)

## CMP-015-00003-3
designator U?, comment PCA9555RGE
Remote 16-Bit I2C and SMBus I/O Expander with Interrupt Output and Configuration Registers, 2.3 to 5.5 V, -40 to 85 degC, 24-pin VQFN (RGE), Green (RoHS & no Sb/Br); Mounting Technology: Surface Mount; Pins: 25; ComponentLink1URL: http://www.ti.com/general/docs/lit/getliterature.tsp?genericPartNumber=PCA9555&fileType=pdf; ComponentLink2URL: http://www.ti.com/litv/pdf/mpds211a; ComponentLink2Description: Package Specification; ComponentLink1Description: Datasheet
footprint RGE0024C (QFN, 24-Leads, Body 4x4mm, Pitch 0.5mm, Thermal Pad 2.1x2.1mm)
footprint RGE0024C (QFN, 24-Leads, Body 4x4mm, Pitch 0.5mm, Thermal Pad 2.1x2.1mm)
pins: 1 P00 (io) "P-port input/output. Push-pull design structure.", 2 P01 (io) "P-port input/output. Push-pull design structure.", 3 P02 (io) "P-port input/output. Push-pull design structure.", 4 P03 (io) "P-port input/output. Push-pull design structure.", 5 P04 (io) "P-port input/output. Push-pull design structure.", 6 P05 (io) "P-port input/output. Push-pull design structure.", 7 P06 (io) "P-port input/output. Push-pull design structure.", 8 P07 (io) "P-port input/output. Push-pull design structure.", 9 GND (power) "Ground", 10 P10 (io) "P-port input/output. Push-pull design structure.", 11 P11 (io) "P-port input/output. Push-pull design structure.", 12 P12 (io) "P-port input/output. Push-pull design structure.", 13 P13 (io) "P-port input/output. Push-pull design structure.", 14 P14 (io) "P-port input/output. Push-pull design structure.", 15 P15 (io) "P-port input/output. Push-pull design structure.", 16 P16 (io) "P-port input/output. Push-pull design structure.", 17 P17 (io) "P-port input/output. Push-pull design structure.", 18 A0 (in) "Address input 0. Connect directly to VCC or ground.", 19 SCL (in) "Serial clock bus. Connect to VCC through a pullup resistor.", 20 SDA (io) "Serial data bus. Connect to VCC through a pullup resistor.", 21 VCC (power) "Supply voltage", 22 ~{INT} (oc) "Interrupt output. Connect to VCC through a pullup resistor.", 23 A1 (in) "Address input 1. Connect directly to VCC or ground.", 24 A2 (in) "Address input 2. Connect directly to VCC or ground.", 25 EP "Exposed thermal pad"

## CMP-015-00004-3
designator U?, comment TXB0108DQSR
Bidirectional Voltage-Level Translator with Auto-Direction Sensing and +/-15 KV ESD Protection, 8 Bit, -40 to 85 degC, 20-Pin USON (DQS), Green (RoHS & no Sb/Br), Tape and Reel; Pins: 20
footprint DQS0020A_V (SON, 20-Leads, Body 4x2mm, Pitch 0.4mm)
footprint DQS0020A_V (SON, 20-Leads, Body 4x2mm, Pitch 0.4mm)
pins: 1 A1 (io), 2 A2 (io), 3 A3 (io), 4 A4 (io), 5 VCCA (power), 6 OE (in), 7 A5 (io), 8 A6 (io), 9 A7 (io), 10 A8 (io), 11 B8 (io), 12 B7 (io), 13 B6 (io), 14 B5 (io), 15 GND (power), 16 VCCB (power), 17 B4 (io), 18 B3 (io), 19 B2 (io), 20 B1 (io)

## CMP-015-00005-4
designator U?, comment TJA1046
Dual High-speed CAN Transceiver with Standby Mode, 4.75 to 5.25 V, 14-Pin HVSON, RoHS, Tape and Reel; Pins: 15
footprint NXP-SOT1086-2_L (SON, 14-Leads, Body 4.6x3.1mm, Pitch 0.65mm, Thermal Pad 4.2x1.59mm, IPC High Density)
footprint NXP-SOT1086-2_L (SON, 14-Leads, Body 4.6x3.1mm, Pitch 0.65mm, Thermal Pad 4.2x1.59mm, IPC High Density)
pins: 1 TXD1 (in) "transmit data input 1", 2 GND1 (power) "transceiver ground 1", 3 VCC1 (power) "transceiver supply voltage 1", 4 RXD1 (out) "receive data output 1; reads out data from the bus lines 1", 5 TXD2 (in) "transmit data input 2", 6 GND2 (power) "transceiver ground 2", 7 VCC2 (power) "transceiver supply voltage 2", 8 RXD2 (out) "receive data output 2; reads out data from the bus lines 2", 9 CANL2 "LOW-level CAN-bus line 2", 10 CANH2 "HIGH-level CAN-bus line 2", 11 STB2 (in) "Standby mode control input 2", 12 CANL1 "LOW-level CAN-bus line 1", 13 CANH1 "HIGH-level CAN-bus line 1", 14 STB1 (in) "Standby mode control input 1", 15 EP (power)

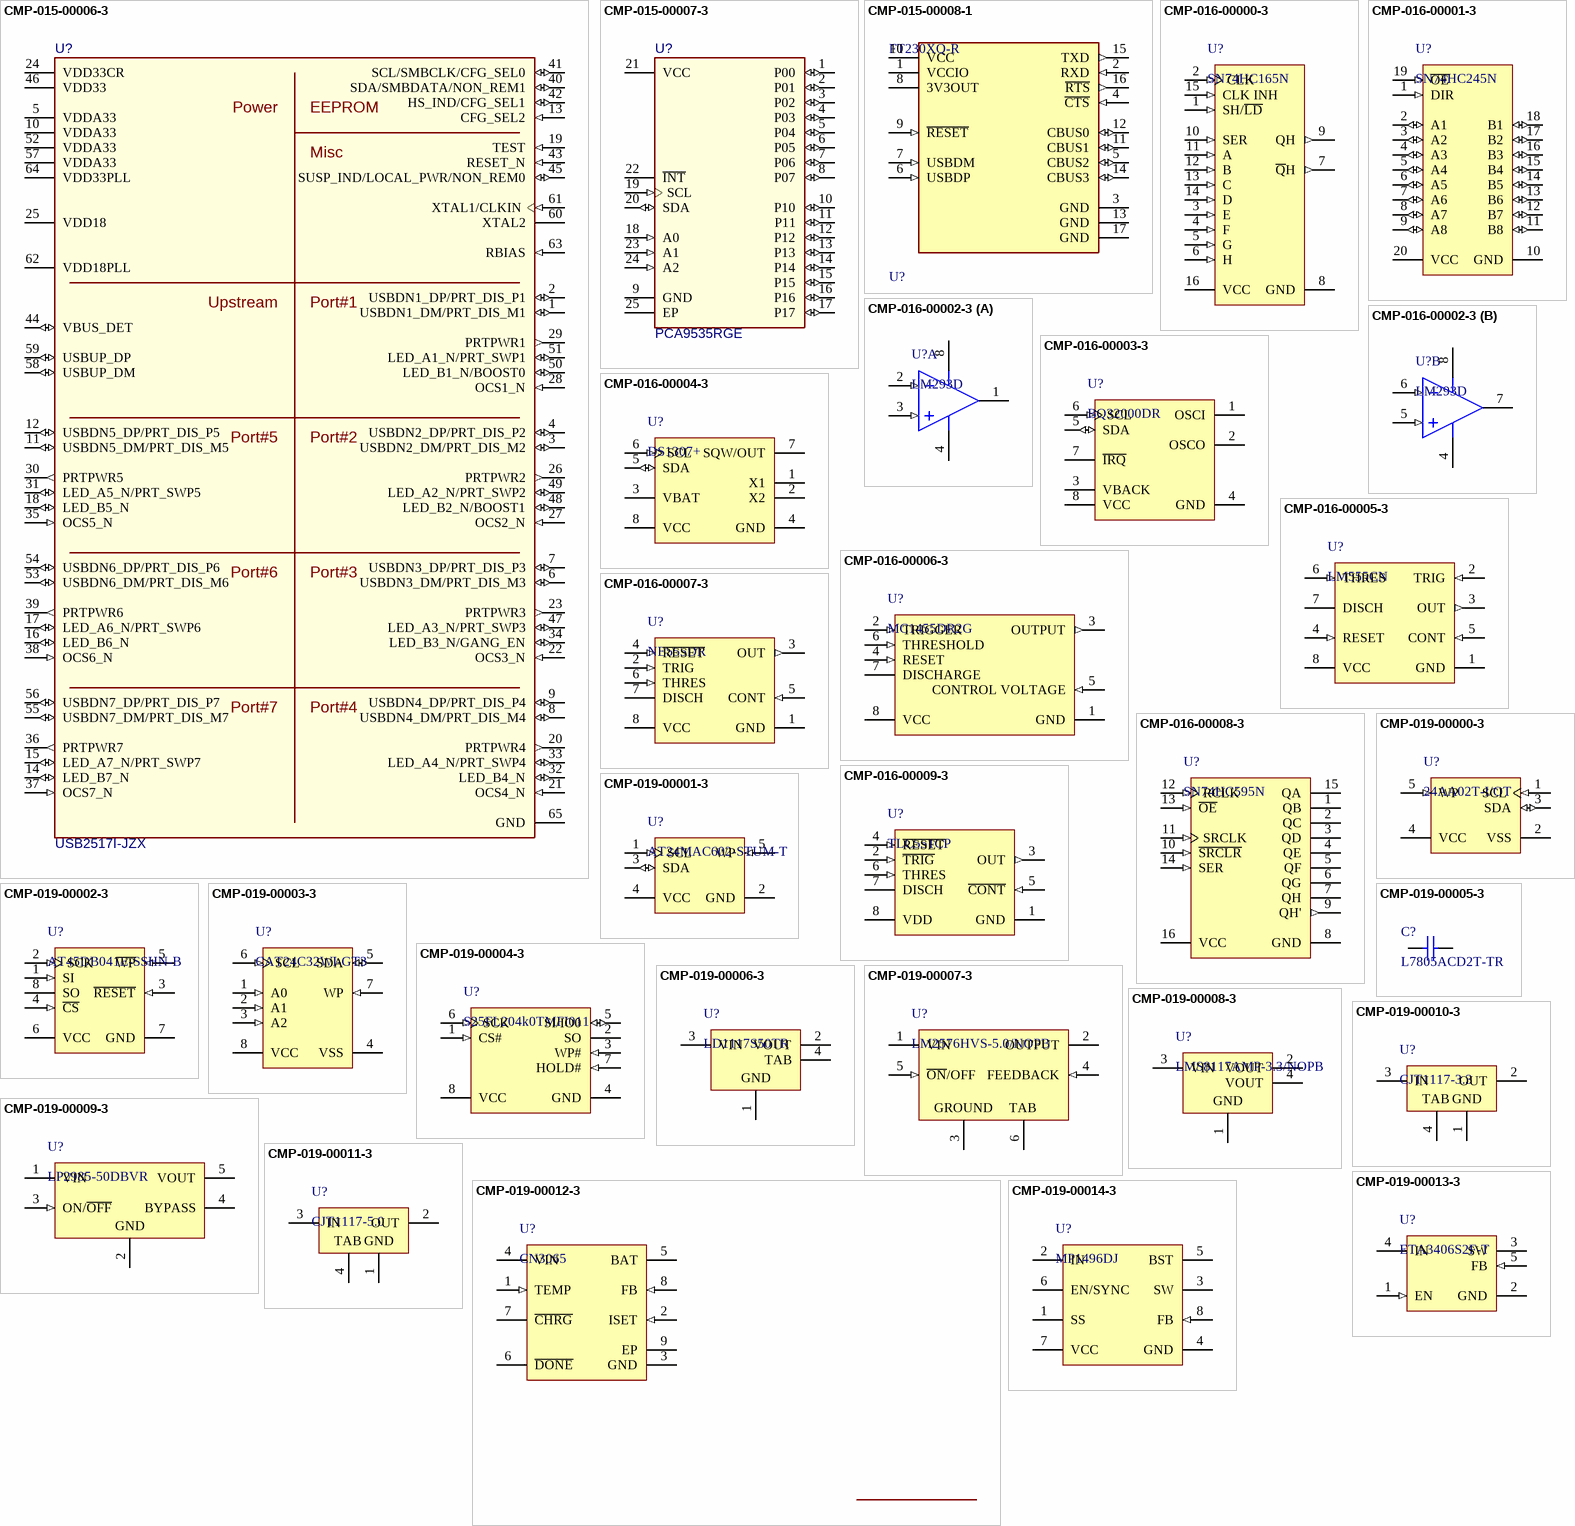
[diagram p18: symbols CMP-015-00006-3 to CMP-019-00014-3]